# Altium footprint library OBC Development Board.PcbLib: 53 footprints (part 4 of 4)
Each footprint in its own frame and in the unit in brackets; x right, y up, seen from the top. Pads: shape width x height; smd on the part's side, far side on the other; paste and mask are expansions set on the pad; w line width, h text height; cw(c..) or ccw(c..) is an arc to the next point about the centre after c.
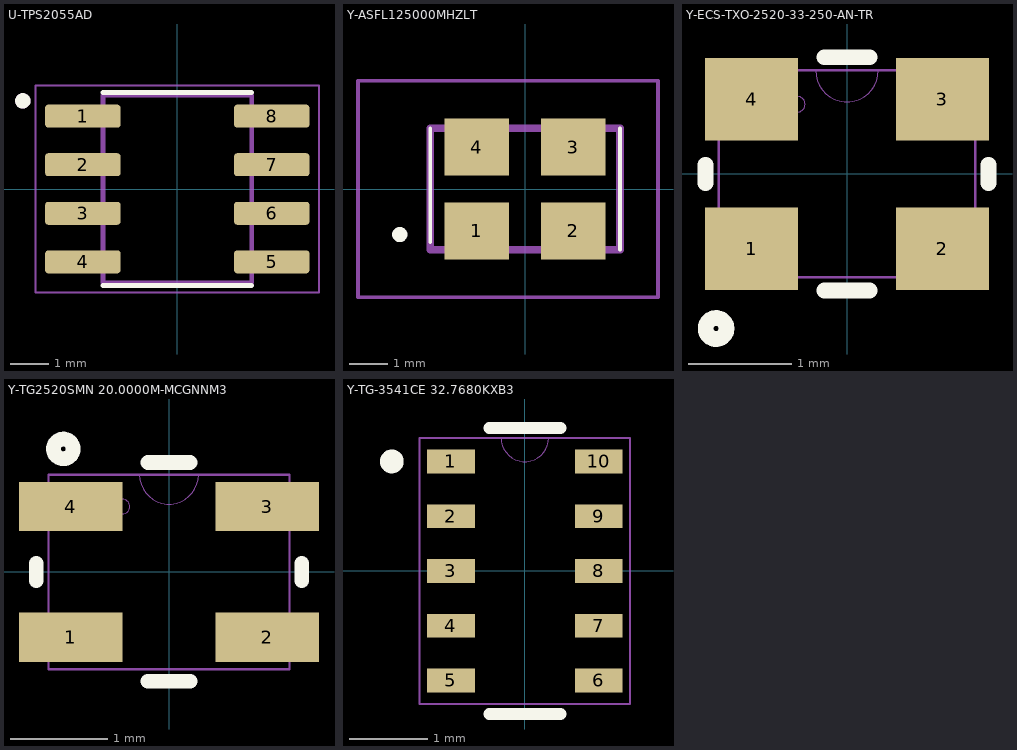
[diagram p3: the footprints below, top view; thin cyan lines are the x and y axes]

## U-TPS2055AD [mm]
pads (8):
  rrect25% 1.97x0.6 smd: 1(-2.47,1.905) 2(-2.47,0.635) 3(-2.47,-0.635) 4(-2.47,-1.905) 5(2.47,-1.905) 6(2.47,-0.635) 7(2.47,0.635) 8(2.47,1.905)
Top Overlay:
  circle w0.2: c-4.04,2.305 r0.1
  lines w0.127: -1.947,-2.525 1.947,-2.525 ; -1.947,2.525 1.947,2.525
Mechanical 13:
  circle w0.2: c-4.04,2.305 r0.1
  lines w0.127: -1.947,-2.452 1.947,-2.452 1.947,2.452 -1.947,2.452 -1.947,-2.452
Mechanical 15:
  lines w0.05: -3.705,-2.702 3.705,-2.702 3.705,2.702 -3.705,2.702 -3.705,-2.702
3D body "D0008A.stp": height 1.63, standoff 0, extent -3.011,-2.451 3.011,2.451

## Y-ASFL125000MHZLT [mm]
pads (4):
  rect 1.7x1.5 smd: 1(-1.27,-1.1) 2(1.27,-1.1) 3(1.27,1.1) 4(-1.27,1.1)
Top Overlay:
  lines w0.1: -2.5,-1.4 -2.5,1.6 ; 2.5,-1.6 2.5,1.6
  lines w0.2: -3.4,-1.2 cw(c-3.3,-1.2) -3.2,-1.2 cw(c-3.3,-1.2) -3.4,-1.2
Mechanical 13:
  lines w0.2: -2.5,-1.6 -2.5,1.6 2.5,1.6 2.5,-1.6 -2.5,-1.6
Mechanical 15:
  lines w0.1: -4.4,-2.85 -4.4,2.85 3.5,2.85 3.5,-2.85 -4.4,-2.85
3D body "ASFL1-25.000MHZ-L-T.stp": height 1.4, standoff 0, extent -2.5,-1.7 2.5,1.7

## Y-ECS-TXO-2520-33-250-AN-TR [mm]
pads (4):
  rect 0.9x0.8 smd paste+0 mask+0: 1(-0.925,-0.725) 2(0.925,-0.725) 3(0.925,0.725) 4(-0.925,0.725)
Top Overlay:
  circle w0.152: c-1.27,-1.5 r0.102
  lines w0.152: -1.372,-0.088 -1.372,0.088 ; -0.218,-1.13 0.218,-1.13 ; -0.218,1.13 0.218,1.13 ; 1.372,-0.088 1.372,0.088
Mechanical 13:
  circle w0: c-0.483,0.675 r0.076
  lines w0: -0.305,1.003 ccw(c0,1.003) 0.305,1.003
  lines w0.025: -1.245,-1.003 1.245,-1.003 1.245,1.003 -1.245,1.003 -1.245,-1.003
3D body "SMD04_2P5X2_EPS.step": height 0.81, standoff 0, extent -1.245,-1.003 1.245,1.003

## Y-TG2520SMN 20.0000M-MCGNNM3 [mil]
pads (4):
  rect 42x20 smd paste+0 mask+0: 1(-40,-26.57) 2(40,-26.57) 3(40,26.57) 4(-40,26.57)
Top Overlay:
  circle w6: c-43,50 r4
  lines w6: -54,-3.47 -54,3.47 ; -8.57,-44.5 8.57,-44.5 ; -8.57,44.5 8.57,44.5 ; 54,-3.47 54,3.47
Mechanical 13:
  circle w0: c-19,26.57 r3
  lines w0: -12,39.5 ccw(c0,39.5) 12,39.5
  lines w1: -49,-39.5 -49,39.5 49,39.5 49,-39.5 -49,-39.5
3D body "SMD04_2P5X2_EPS.step": height 32.09, standoff 0, extent -49.02,-39.49 49.02,39.49

## Y-TG-3541CE 32.7680KXB3 [mil]
pads (10):
  rect 24x12 smd paste+0 mask+0: 1(-37.21,55.12) 2(-37.21,27.56) 3(-37.21,0) 4(-37.21,-27.56) 5(-37.21,-55.12) 6(37.21,-55.12) 7(37.21,-27.56) 8(37.21,0) 9(37.21,27.56) 10(37.21,55.12)
Top Overlay:
  circle w6: c-66.99,55.12 r3
  lines w6: -17.92,-72 17.92,-72 ; -17.92,72 17.92,72
Mechanical 13:
  lines w0: -12,67 ccw(c0,67) 12,67
  lines w1: -53,-67 53,-67 53,67 -53,67 -53,-67
3D body "TG-3541CE327680KXB3_EPS.step": height 39.09, standoff 0, extent -52.99,-67.01 52.99,67.01